# Altium footprint library myPcbLib.PcbLib: 987 footprints (part 10 of 62)
Each footprint in its own frame and in the unit in brackets; x right, y up, seen from the top. Pads: shape width x height; smd on the part's side, far side on the other; paste and mask are expansions set on the pad; w line width, h text height; cw(c..) or ccw(c..) is an arc to the next point about the centre after c.
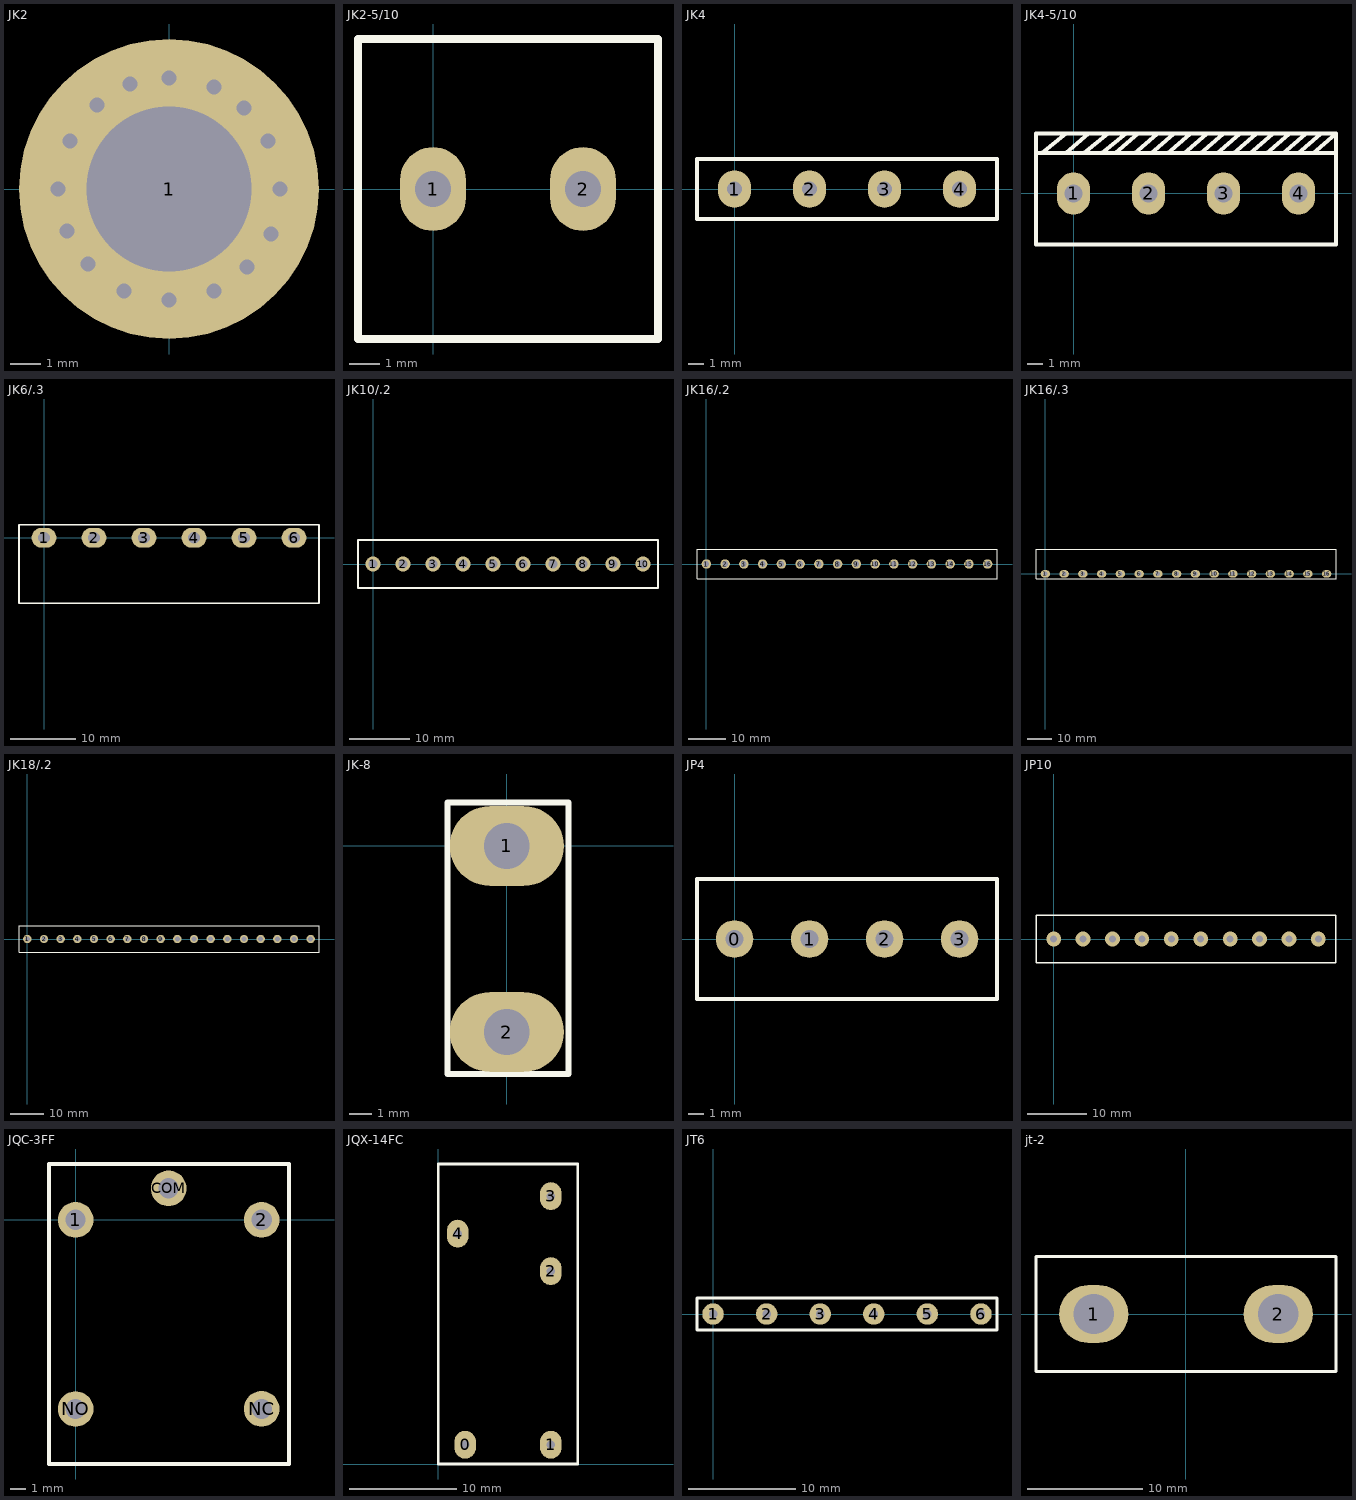
[diagram p9: the footprints below, top view; thin cyan lines are the x and y axes]

## JK2 [mm]
pads (1):
  round 10 hole 5.5 unplated: 1(0,0)
via -1.3,3.5 diameter 0.5 hole 0.5
via -3.3,1.6 diameter 0.5 hole 0.5
via -3.4,-1.4 diameter 0.5 hole 0.5
via -1.5,-3.4 diameter 0.5 hole 0.5
via 1.5,-3.4 diameter 0.5 hole 0.5
via 3.4,-1.5 diameter 0.5 hole 0.5
via 3.3,1.6 diameter 0.5 hole 0.5
via 1.5,3.4 diameter 0.5 hole 0.5
via -2.4,2.8 diameter 0.5 hole 0.5
via 2.6,-2.6 diameter 0.5 hole 0.5
via -2.7,-2.5 diameter 0.5 hole 0.5
via 2.5,2.7 diameter 0.5 hole 0.5
via 3.7,0 diameter 0.5 hole 0.5
via -3.7,0 diameter 0.5 hole 0.5
via 0,-3.7 diameter 0.5 hole 0.5
via 0,3.7 diameter 0.5 hole 0.5

## JK2-5/10 [mm]
pads (2):
  oval 2.2x2.8 hole 1.2: 1(0,0) 2(5,0)
Top Overlay:
  lines w0.254: -2.5,-5 7.5,-5 7.5,5 -2.5,5 -2.5,-5

## JK4 [mm]
pads (4):
  oval 2.2x2.5 hole 1: 1(0,0) 2(5,0) 3(10,0) 4(15,0)
Top Overlay:
  lines w0.254: -2.5,-2 -2.5,2 17.5,2 17.5,-2 -2.5,-2

## JK4-5/10 [mm]
pads (4):
  oval 2.2x2.8 hole 1.2: 1(0,0) 2(5,0) 3(10,0) 4(15,0)
Top Overlay:
  lines w0.254: -2.5,2.7 17.5,2.7 ; -2.1,2.7 -0.5,4 ; -0.5,2.7 1,4 ; 0.7,2.7 2.3,4 ; 1.9,2.7 3.5,4 ; 2.8,2.7 4.3,4 ; 4.066,2.677 5.566,3.977 ; 5.166,2.677 6.666,3.977 ; 6.266,2.677 7.766,3.977 ; 7.366,2.677 8.866,3.977 ; 8.466,2.677 9.966,3.977 ; 9.566,2.677 11.066,3.977 ; 10.666,2.677 12.166,3.977 ; 11.766,2.677 13.266,3.977 ; 12.866,2.677 14.366,3.977 ; 13.966,2.677 15.466,3.977 ; 14.966,2.677 16.466,3.977 ; 15.966,2.677 17.466,3.977 ; -2.5,-3.4 17.5,-3.4 17.5,4 -2.5,4 -2.5,-3.4

## JK6/.3 [mm] "KF7.62"
pads (6):
  oval 3.8x3 hole 1.8: 1(0,0) 2(7.62,0) 3(15.24,0) 4(22.86,0) 5(30.48,0) 6(38.1,0)
Top Overlay:
  lines w0.254: -3.81,-10 41.91,-10 41.91,2 1.5,2 -3.81,2 -3.81,-10

## JK10/.2 [mm]
pads (10):
  round 2.5 hole 1.5: 1(0,0) 2(5,0) 3(10,0) 4(15,0) 5(20,0) 6(25,0) 7(30,0) 8(35,0) 9(40,0) 10(45,0)
Top Overlay:
  lines w0.254: -2.5,-4 -2.5,4 47.5,4 47.5,-0.5 47.5,-4 -2.5,-4

## JK16/.2 [mm]
pads (16):
  round 2.5 hole 1.5: 1(0,0) 2(5,0) 3(10,0) 4(15,0) 5(20,0) 6(25,0) 7(30,0) 8(35,0) 9(40,0) 10(45,0) 11(50,0) 12(55,0) 13(60,0) 14(65,0) 15(70,0) 16(75,0)
Top Overlay:
  lines w0.254: -2.5,-4 -2.5,4 77.5,4 77.5,-4 -2.5,-4

## JK16/.3 [mm] "KF7.62"
pads (16):
  oval 3.8x3 hole 1.8: 1(0,0) 2(7.62,0) 3(15.24,0) 4(22.86,0) 5(30.48,0) 6(38.1,0) 7(45.72,0) 8(53.34,0) 9(60.96,0) 10(68.58,0) 11(76.2,0) 12(83.82,0) 13(91.44,0) 14(99.06,0) 15(106.68,0) 16(114.3,0)
Top Overlay:
  lines w0.254: -3.81,-2 -3.81,10 1.5,10 118.11,10 118.11,-2 -3.81,-2

## JK18/.2 [mm]
pads (18):
  round 2.5 hole 1.5: 1(0,0) 2(5,0) 3(10,0) 4(15,0) 5(20,0) 6(25,0) 7(30,0) 8(35,0) 9(40,0) 10(45,0) 11(50,0) 12(55,0) 13(60,0) 14(65,0) 15(70,0) 16(75,0) 17(80,0) 18(85,0)
Top Overlay:
  lines w0.254: -2.5,-4 87.5,-4 87.5,4 -2.5,4 -2.5,-4

## JK-8 [mm]
pads (2):
  oval 5x3.5 hole 2: 1(0,0) 2(0,-8.16)
Top Overlay:
  lines w0.254: -2.6,-10 2.7,-10 2.7,1.905 -2.6,1.905 -2.6,-10

## JP4 [mm] "JP"
height 10
pads (4):
  round 2.5 hole 1.2: 0(0,0) 1(5,0) 2(10,0) 3(15,0)
Top Overlay:
  lines w0.254: -2.5,-4 17.5,-4 17.5,4 -2.5,4 -2.5,-4

## JP10 [mm] "JP10"
height 10
via 45,0 diameter 2.5 hole 1.2
via 40,0 diameter 2.5 hole 1.2
via 35,0 diameter 2.5 hole 1.2
via 30,0 diameter 2.5 hole 1.2
via 25,0 diameter 2.5 hole 1.2
via 20,0 diameter 2.5 hole 1.2
via 15,0 diameter 2.5 hole 1.2
via 10,0 diameter 2.5 hole 1.2
via 5,0 diameter 2.5 hole 1.2
via 0,0 diameter 2.5 hole 1.2
Top Overlay:
  lines w0.254: -3,-4 -3,4 48,4 48,-4 -3,-4

## JQC-3FF [mm]
pads (5):
  round 2.3 hole 1.3: 1(0,0) 2(12,0) COM(6,2.032) NC(12,-12.192) NO(0,-12.2)
Top Overlay:
  lines w0.254: -1.728,-15.748 13.772,-15.748 13.772,3.6 -1.728,3.6 -1.728,-15.748

## JQX-14FC [mm]
pads (5):
  oval 2x2.6 hole 0.8: 0(2.5,1.8) 1(10.5,1.8) 2(10.5,18) 3(10.5,25) 4(1.8,21.5)
Top Overlay:
  lines w0.254: 0,0 0,28 13,28 13,0 0,0

## JT6 [mm]
height 5
pads (6):
  round 2 hole 0.8: 1(0,0) 2(5,0) 3(10,0) 4(15,0) 5(20,0) 6(25,0)
Top Overlay:
  lines w0.254: -1.5,-1.5 -1.5,1.5 26.5,1.5 26.5,-1.5 -1.5,-1.5

## jt-2 [mm]
pads (2):
  oval 6x5 hole 3.5: 1(-8,0) 2(8,0)
Top Overlay:
  lines w0.254: -13,-5 -13,5 13,5 13,-5 -13,-5